# Altium footprint library BMS_Slave.PcbLib: 58 footprints (part 2 of 4)
Each footprint in its own frame and in the unit in brackets; x right, y up, seen from the top. Pads: shape width x height; smd on the part's side, far side on the other; paste and mask are expansions set on the pad; w line width, h text height; cw(c..) or ccw(c..) is an arc to the next point about the centre after c.
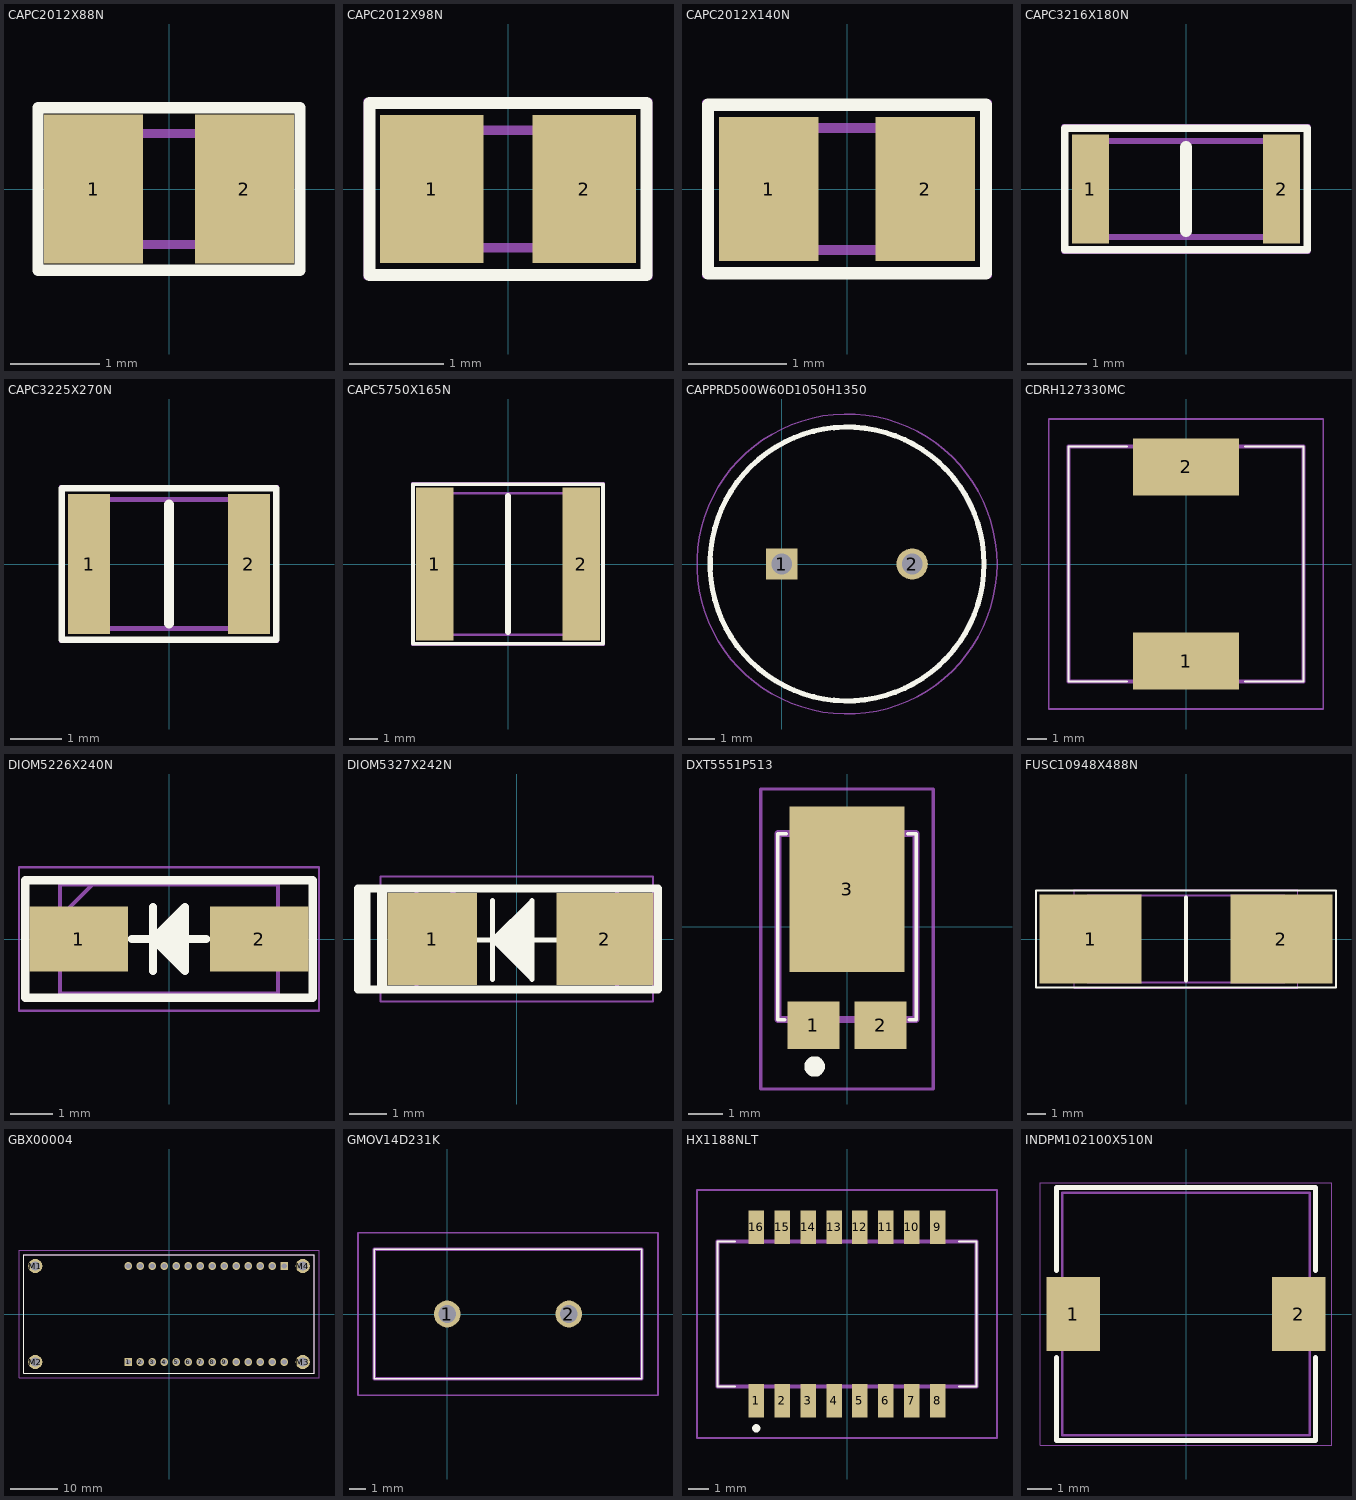
[diagram p1: the footprints below, top view; thin cyan lines are the x and y axes]

## CAPC2012X88N [mil]
pads (2):
  rect 44x66 smd: 1(-33.42,0) 2(33.42,0)
Top Overlay:
  lines w5: -58,-36 58,-36 58,36 -58,36 -58,-36
Mechanical 13:
  lines w3.94: -39.37,-24.61 -39.37,24.61 39.37,24.61 39.37,-24.61 -39.37,-24.61
Mechanical 15:
  lines w1.97: -57.48,-35.04 -57.48,35.04 57.48,35.04 57.48,-35.04 -57.48,-35.04
3D body "C0805C103K2RACTU.stp": height 34.65, standoff 0, extent -39.37,-24.61 39.37,24.61

## CAPC2012X98N [mm]
pads (2):
  rect 1.1x1.57 smd: 1(-0.81,0) 2(0.81,0)
Top Overlay:
  lines w0.127: -1.473,-0.914 -1.473,0.914 1.473,0.914 1.473,-0.914 -1.473,-0.914
Mechanical 13:
  lines w0.1: -1,-0.625 -1,0.625 1,0.625 1,-0.625 -1,-0.625
Mechanical 15:
  lines w0.05: -1.51,-0.94 -1.51,0.94 1.51,0.94 1.51,-0.94 -1.51,-0.94
3D body "C0805X103M2RACAUTO.stp": height 0.98, standoff 0, extent -1,-0.625 1,0.625

## CAPC2012X140N [mm]
pads (2):
  rect 1.02x1.47 smd: 1(-0.8,0) 2(0.8,0)
Top Overlay:
  lines w0.127: -1.422,-0.864 -1.422,0.864 1.422,0.864 1.422,-0.864 -1.422,-0.864
Mechanical 13:
  lines w0.1: -1,-0.625 -1,0.625 1,0.625 1,-0.625 -1,-0.625
Mechanical 15:
  lines w0.05: -1.46,-0.89 -1.46,0.89 1.46,0.89 1.46,-0.89 -1.46,-0.89
3D body "C0805C104M3RACTU.stp": height 1.4, standoff 0, extent -1,-0.625 1,0.625

## CAPC3216X180N [mm]
pads (2):
  rect 0.62x1.82 smd: 1(-1.6,0) 2(1.6,0)
Top Overlay:
  lines w0.127: -2.032,-1.016 -2.032,1.016 2.032,1.016 2.032,-1.016 -2.032,-1.016
  lines w0.2: 0,-0.7 0,0.7
Mechanical 13:
  lines w0.1: -1.6,-0.8 1.6,-0.8 1.6,0.8 -1.6,0.8 -1.6,-0.8
Mechanical 15:
  lines w0.05: -2.06,-1.06 2.06,-1.06 2.06,1.06 -2.06,1.06 -2.06,-1.06
3D body "C3216JB1A336M160AB.stp": height 1.8, standoff 0, extent -1.6,-0.8 1.6,0.8

## CAPC3225X270N [mm]
pads (2):
  rect 0.82x2.72 smd: 1(-1.55,0) 2(1.55,0)
Top Overlay:
  lines w0.127: -2.083,-1.473 2.083,-1.473 2.083,1.473 -2.083,1.473 -2.083,-1.473
  lines w0.2: 0,-1.15 0,1.15
Mechanical 13:
  lines w0.1: -1.6,-1.25 1.6,-1.25 1.6,1.25 -1.6,1.25 -1.6,-1.25
Mechanical 15:
  lines w0.05: -2.11,-1.51 2.11,-1.51 2.11,1.51 -2.11,1.51 -2.11,-1.51
3D body "GRM32ER61A107ME20L.stp": height 2.7, standoff 0, extent -1.6,-1.25 1.6,1.25

## CAPC5750X165N [mm]
pads (2):
  rect 1.33x5.41 smd: 1(-2.59,0) 2(2.59,0)
Top Overlay:
  lines w0.127: -3.353,-2.819 -3.353,2.819 3.353,2.819 3.353,-2.819 -3.353,-2.819
  lines w0.2: 0,-2.4 0,2.4
Mechanical 13:
  lines w0.1: -2.85,-2.5 -2.85,2.5 2.85,2.5 2.85,-2.5 -2.85,-2.5
Mechanical 15:
  lines w0.05: -3.405,-2.86 -3.405,2.86 3.405,2.86 3.405,-2.86 -3.405,-2.86
3D body "C2220C105KARACAUTO.stp": height 1.65, standoff 0, extent -2.85,-2.5 2.85,2.5

## CAPPRD500W60D1050H1350 [mm]
pads (2):
  rect 1.2x1.2 hole 0.8: 1(0,0)
  round 1.2 hole 0.8: 2(5,0)
Top Overlay:
  circle w0.2: c2.5,0 r5.25
Mechanical 13:
  circle w0.1: c2.5,0 r5.25
Mechanical 15:
  circle w0.05: c2.5,0 r5.75
3D body "25ZLJ470M10X12.5.stp": height 13.5, standoff -10, extent -2.75,-5.247 7.75,5.247

## CDRH127330MC [mm]
pads (2):
  rect 5.4x2.9 smd: 1(0,-4.95) 2(0,4.95)
Top Overlay:
  lines w0.1: -3,-6 -6,-6 -6,6 -3,6 ; 3,-6 6,-6 6,6 3,6
Mechanical 13:
  lines w0.2: -6,-6 6,-6 6,6 -6,6 -6,-6
Mechanical 15:
  lines w0.1: -7,-7.4 7,-7.4 7,7.4 -7,7.4 -7,-7.4
3D body "CDRH127-330MC.stp": height 8.1, standoff 0, extent -6,-6.11 6,6.11

## DIOM5226X240N [mm]
pads (2):
  rect 2.35x1.55 smd: 1(-2.15,0) 2(2.15,0)
Top Overlay:
  region: -0.381,0 0.381,0.762 0.381,-0.762
  lines w0.198: -3.429,-1.397 -3.429,1.397 ; -0.889,0 -0.381,0 ; -0.381,-0.762 -0.381,0.762 ; 0.381,0 0.889,0 ; 3.429,-1.397 3.429,1.397 ; -0.381,0 0.381,0.762 0.381,-0.762 -0.381,0
  lines w0.2: -3.429,-1.397 3.429,-1.397 ; -3.429,1.397 3.429,1.397
Mechanical 13:
  lines w0.1: -2.598,0.528 -1.822,1.302 ; -2.598,-1.302 -2.598,1.302 2.598,1.302 2.598,-1.302 -2.598,-1.302
Mechanical 15:
  lines w0.05: -3.575,-1.71 -3.575,1.71 3.575,1.71 3.575,-1.71 -3.575,-1.71
3D body "S1D-13-F.stp": height 2.4, standoff 0, extent -2.598,-1.302 2.598,1.302

## DIOM5327X242N [mil]
pads (2):
  rect 93x96 smd: 1(-87.84,0)
  rect 101x96 smd: 2(91.84,0)
Top Overlay:
  rectangle: -145,-52.5 -135,52.5
  rectangle: -162,-52.5 -152,52.5
  region: 16,40 -25,-1 16,-42
  lines w5: -65,-1 -25,-1 ; -25,-42 -25,40 ; 16,-1 56,-1 ; -25,-1 16,-42 16,40 -25,-1
  lines w7.87: -165,-52.5 -165,52.5 147,52.5 147,-52.5 -165,-52.5
Mechanical 13:
  lines w3.94: -104.25,10.24 -61.89,52.56 ; -104.25,-52.56 104.25,-52.56 104.25,52.56 -104.25,52.56 -104.25,-52.56
Mechanical 15:
  lines w1.97: -141.73,-64.96 141.73,-64.96 141.73,64.96 -141.73,64.96 -141.73,-64.96
3D body "1N4007.stp": height 95.28, standoff 0, extent -104.23,-52.56 104.23,52.56

## DXT5551P513 [mm]
pads (3):
  rect 1.524x1.4 smd: 1(-0.987,-2.89) 2(0.987,-2.89)
  rect 3.36x4.86 smd: 3(0,1.092)
Top Overlay:
  lines w0.1: -2.025,-2.725 -2.025,2.725 ; 2.025,-2.725 2.025,2.725
  lines w0.102: -2.025,-2.725 -1.829,-2.725 ; -2.025,2.725 -1.778,2.725 ; 1.778,2.725 2.025,2.725 ; 1.829,-2.725 2.025,-2.725
  lines w0.3: -1.1,-4.1 cw(c-0.95,-4.1) -0.8,-4.1 cw(c-0.95,-4.1) -1.1,-4.1
Mechanical 13:
  lines w0.2: -2.025,-2.725 2.025,-2.725 2.025,2.725 -2.025,2.725 -2.025,-2.725
Mechanical 15:
  lines w0.1: -2.525,-4.76 2.525,-4.76 2.525,4.032 -2.525,4.032 -2.525,-4.76
3D body "DXT5551P5-13.STEP": height 1.15, standoff 0, extent -1.983,-3.252 1.983,3.252

## FUSC10948X488N [mm]
pads (2):
  rect 5.6x4.91 smd: 1(-5.25,0) 2(5.25,0)
Top Overlay:
  lines w0.127: -8.255,-2.667 8.255,-2.667 8.255,2.667 -8.255,2.667 -8.255,-2.667
  lines w0.2: 0,-2.29 0,2.29
Mechanical 13:
  lines w0.1: -5.43,-2.39 -5.43,2.39 5.43,2.39 5.43,-2.39 -5.43,-2.39
Mechanical 15:
  lines w0.05: -6.15,-2.705 -6.15,2.705 6.15,2.705 6.15,-2.705 -6.15,-2.705
3D body "0885001.DR.stp": height 4.88, standoff 0, extent -5.43,-2.39 5.43,2.39

## GBX00004 [mm]
pads (32):
  rect 1.665x1.665 hole 1.11: 1(-8.63,-10.16) 15(24.39,10.16)
  round 1.665 hole 1.11: 2(-6.09,-10.16) 3(-3.55,-10.16) 4(-1.01,-10.16) 5(1.53,-10.16) 6(4.07,-10.16) 7(6.61,-10.16) 8(9.15,-10.16) 9(11.69,-10.16) 10(14.23,-10.16) 11(16.77,-10.16) 12(19.31,-10.16) 13(21.85,-10.16) 14(24.39,-10.16) 16(21.85,10.16) 17(19.31,10.16) 18(16.77,10.16) 19(14.23,10.16) 20(11.69,10.16) 21(9.15,10.16) 22(6.61,10.16) 23(4.07,10.16) 24(1.53,10.16) 25(-1.01,10.16) 26(-3.55,10.16) 27(-6.09,10.16) 28(-8.63,10.16)
  round 3 hole 2: M1(-28.31,10.16) M2(-28.31,-10.16) M3(28.31,-10.16) M4(28.31,10.16)
Top Overlay:
  lines w0.1: -30.75,-12.5 -30.75,12.5 30.75,12.5 30.75,-12.5 -30.75,-12.5
Mechanical 13:
  lines w0.2: -30.75,-12.5 -30.75,12.5 30.75,12.5 30.75,-12.5 -30.75,-12.5
Mechanical 15:
  lines w0.1: -31.75,-13.5 -31.75,13.5 31.75,13.5 31.75,-13.5 -31.75,-13.5
3D body "GBX00004.stp": height 5.1, standoff -5, extent -30.75,-12.5 30.75,12.5

## GMOV14D231K [mm]
pads (2):
  round 1.65 hole 1.1: 1(0,0) 2(7.5,0)
Top Overlay:
  lines w0.1: -4.5,-4 -4.5,4 12,4 12,-4 -4.5,-4
Mechanical 13:
  lines w0.2: -4.5,-4 -4.5,4 12,4 12,-4 -4.5,-4
Mechanical 15:
  lines w0.1: -5.5,-5 -5.5,5 13,5 13,-5 -5.5,-5
3D body "GMOV-14D231K.stp": height 20.1, standoff -5, extent -4.5,-4 12,4

## HX1188NLT [mm]
pads (16):
  rect 0.76x1.65 smd: 1(-4.445,-4.255) 2(-3.175,-4.255) 3(-1.905,-4.255) 4(-0.635,-4.255) 5(0.635,-4.255) 6(1.905,-4.255) 7(3.175,-4.255) 8(4.445,-4.255) 9(4.445,4.255) 10(3.175,4.255) 11(1.905,4.255) 12(0.635,4.255) 13(-0.635,4.255) 14(-1.905,4.255) 15(-3.175,4.255) 16(-4.445,4.255)
Top Overlay:
  lines w0.1: -5.5,-3.555 -6.35,-3.555 -6.35,3.555 -5.5,3.555 ; 5.5,-3.555 6.35,-3.555 6.35,3.555 5.5,3.555
  lines w0.2: -4.445,-5.7 ccw(c-4.445,-5.6) -4.445,-5.5 ccw(c-4.445,-5.6) -4.445,-5.7
Mechanical 13:
  lines w0.2: -6.35,-3.555 -6.35,3.555 6.35,3.555 6.35,-3.555 -6.35,-3.555
Mechanical 15:
  lines w0.1: -7.35,-6.08 -7.35,6.08 7.35,6.08 7.35,-6.08 -7.35,-6.08
3D body "HX1188NLT.stp": height 6.17, standoff 0, extent -6.35,-5.004 6.35,5.004

## INDPM102100X510N [mm]
pads (2):
  rect 2.2x3.05 smd: 1(-4.65,0) 2(4.65,0)
Top Overlay:
  lines w0.199: -5.334,-5.207 -5.334,-1.778 ; -5.334,1.778 -5.334,5.207 ; 5.334,-5.207 5.334,-1.778 ; 5.334,1.778 5.334,5.207
  lines w0.2: -5.334,-5.207 5.334,-5.207 ; -5.334,5.207 5.334,5.207
Mechanical 13:
  lines w0.1: -5.1,-5 5.1,-5 5.1,5 -5.1,5 -5.1,-5
Mechanical 15:
  lines w0.05: -6,-5.4 6,-5.4 6,5.4 -6,5.4 -6,-5.4
3D body "CDRH105RNP-151NC--3DModel-STEP-56544.STEP": height 5.1, standoff 0, extent -5.1,-5 5.1,5